# Altium footprint library UP-ROBOT Devices(2013-02-26).PcbLib: 150 footprints (part 4 of 10)
Each footprint in its own frame and in the unit in brackets; x right, y up, seen from the top. Pads: shape width x height; smd on the part's side, far side on the other; paste and mask are expansions set on the pad; w line width, h text height; cw(c..) or ccw(c..) is an arc to the next point about the centre after c.
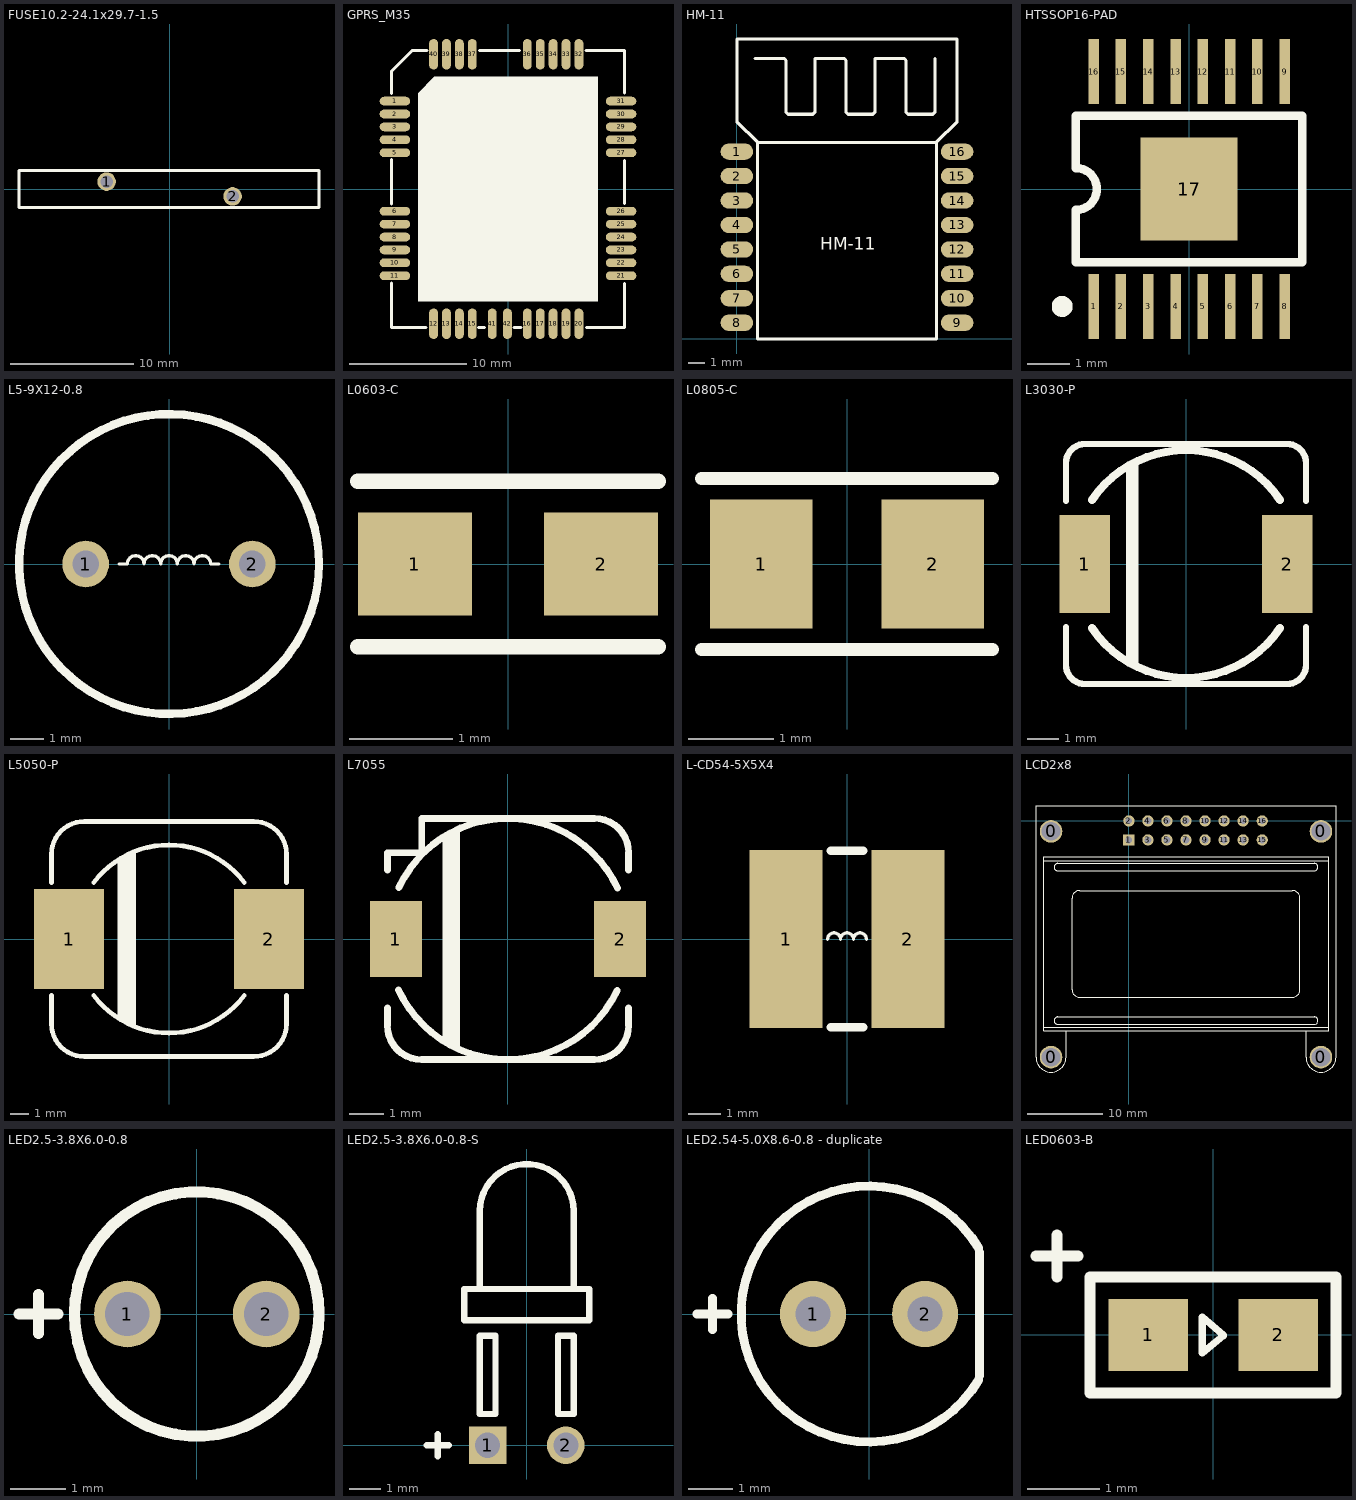
[diagram p3: the footprints below, top view; thin cyan lines are the x and y axes]

## FUSE10.2-24.1x29.7-1.5 [mm]
pads (2):
  round 1.5 hole 1: 1(-5.1,0.6) 2(5.1,-0.6)
Top Overlay:
  lines w0.254: -12.2,-1.5 12.1,-1.5 12.1,1.5 -12.2,1.5 -12.2,-1.5
3D body: height 29.85, standoff -3.85, extent -12.1,-1.5 12,1.5

## GPRS_M35 [mm]
pads (42):
  oval 2.6x0.75 smd: 1(-9.65,7.5) 2(-9.65,6.4) 3(-9.65,5.3) 4(-9.65,4.2) 5(-9.65,3.1) 6(-9.65,-1.9) 7(-9.65,-3) 8(-9.65,-4.1) 9(-9.65,-5.2) 10(-9.65,-6.3) 11(-9.65,-7.4) 21(9.65,-7.4) 22(9.65,-6.3) 23(9.65,-5.2) 24(9.65,-4.1) 25(9.65,-3) 26(9.65,-1.9) 27(9.65,3.1) 28(9.65,4.2) 29(9.65,5.3) 30(9.65,6.4) 31(9.65,7.5)
  oval 0.75x2.6 smd: 12(-6.35,-11.5) 13(-5.25,-11.5) 14(-4.15,-11.5) 15(-3.05,-11.5) 16(1.65,-11.5) 17(2.75,-11.5) 18(3.85,-11.5) 19(4.95,-11.5) 20(6.05,-11.5) 32(6.05,11.5) 33(4.95,11.5) 34(3.85,11.5) 35(2.75,11.5) 36(1.65,11.5) 37(-3.05,11.5) 38(-4.15,11.5) 39(-5.25,11.5) 40(-6.35,11.5) 41(-1.35,-11.5) 42(-0.05,-11.5)
Top Overlay:
  rectangle: -7.7,-9.6 -6.2,8.2
  region: -6.291,6.775 -4.884,8.182 -6.299,9.596 -7.706,8.189
  rectangle: -6.3,-9.6 7.7,9.6
  lines w0.254: -9.95,-8.025 -9.95,-11.8 -7,-11.8 ; -9.95,-1.275 -9.95,2.5 ; -9.95,8.15 -9.95,10.05 -8.2,11.8 ; -8.175,11.8 -6.9,11.8 ; -2.5,-11.8 -2,-11.8 ; -2.45,11.8 1,11.8 ; 0.5,-11.8 1.1,-11.8 ; 6.65,11.8 9.95,11.8 9.95,8.2 ; 6.7,-11.8 9.95,-11.8 9.95,-8.075 ; 9.95,-1.225 9.95,2.425

## HM-11 [mm] "Bluetooth4.0 HM-11"
pads (16):
  oval 2x1 smd: 1(0,11.5) 2(0,10) 3(0,8.5) 4(0,7) 5(0,5.5) 6(0,4) 7(0,2.5) 8(0,1) 9(13.513,1) 10(13.513,2.5) 11(13.513,4) 12(13.513,5.5) 13(13.513,7) 14(13.513,8.5) 15(13.513,10) 16(13.513,11.5)
Top Overlay:
  lines w0.2: 1.106,17.224 2.884,17.224 3.011,17.097 3.011,13.922 3.138,13.795 4.662,13.795 4.789,13.922 4.789,17.224 6.567,17.224 6.694,17.097 6.694,13.922 6.821,13.795 8.345,13.795 8.472,13.922 8.472,17.224 10.25,17.224 10.377,17.097 10.377,13.922 10.504,13.795 12.028,13.795 12.155,13.922 12.155,17.224 ; 1.27,12.065 1.27,0 12.243,0 12.243,12.065 ; 1.27,12.065 12.243,12.065 ; 1.27,12.065 0,13.335 0,18.415 13.513,18.415 13.513,13.335 12.243,12.065
  text "HM-11" at 5.11,5.47 h0.76

## HTSSOP16-PAD [mm]
pads (17):
  rect 0.25x1.55 smd: 1(-2.275,-2.8) 2(-1.625,-2.8) 3(-0.975,-2.8) 4(-0.325,-2.8) 5(0.325,-2.8) 6(0.975,-2.8) 7(1.625,-2.8) 8(2.275,-2.8) 9(2.275,2.8) 10(1.625,2.8) 11(0.975,2.8) 12(0.325,2.8) 13(-0.325,2.8) 14(-0.975,2.8) 15(-1.625,2.8) 16(-2.275,2.8)
  rect 2.31x2.46 smd: 17(0,0)
Top Overlay:
  circle w0.25: c-3.025,-2.8 r0.125
  lines w0.203: -2.7,-1.75 -2.7,-0.5 ccw(c-2.7,0) -2.7,0.5 -2.7,1.75 0,1.75 2.7,1.75 2.7,-1.75 -2.7,-1.75
3D body: height 1.2, standoff 0, extent -2.56,-3.3 2.54,3.3

## L5-9X12-0.8 [mm]
pads (2):
  round 1.4 hole 0.8: 1(-2.5,0) 2(2.5,0)
Top Overlay:
  circle w0.254: c0,0 r4.5
  lines w0.1: -1.5,0 -1.25,0 cw(c-1,0) -0.75,0 cw(c-0.5,0) -0.25,0 cw(c0,0) 0.25,0 cw(c0.5,0) 0.75,0 cw(c1,0) 1.25,0 1.5,0

## L0603-C [mm]
pads (2):
  rect 1.1x1 smd: 1(-0.9,0) 2(0.9,0)
Top Overlay:
  lines w0.152: -1.45,-0.8 1.45,-0.8 ; -1.45,0.8 0,0.8 1.45,0.8
3D body: height 0.46, standoff 0, extent -0.762,-0.386 0.762,0.381

## L0805-C [mm]
pads (2):
  rect 1.2x1.5 smd: 1(-1,0) 2(1,0)
Top Overlay:
  lines w0.152: -1.7,-1 1.7,-1 ; -1.7,1 1.7,1
3D body: height 0.61, standoff 0, extent -0.95,-0.65 1.082,0.625

## L3030-P [mm]
pads (2):
  rect 1.6x3.1 smd: 1(-3.2,0) 2(3.2,0)
Top Overlay:
  rectangle: -1.9,-3.2 -1.5,3.2
  lines w0.203: -3.8,-2 -3.8,-3.2 ccw(c-3.2,-3.2) -3.2,-3.8 3.2,-3.8 ccw(c3.2,-3.2) 3.8,-3.2 3.8,-2 ; -3.8,2 -3.8,3.2 cw(c-3.2,3.2) -3.2,3.8 3.2,3.8 cw(c3.2,3.2) 3.8,3.2 3.8,2
  lines w0.254: -2.977,-2.034 ccw(c0,0) 2.977,-2.034 ; -2.977,2.034 cw(c0,0) 2.977,2.034
3D body: height 4.36, standoff 0, extent -3.5,-3.55 3.5,3.45

## L5050-P [mm]
pads (2):
  rect 3.8x5.4 smd: 1(-5.4,0) 2(5.4,0)
Top Overlay:
  lines w0.254: -6.35,-3.048 -6.35,-4.572 ccw(c-4.572,-4.572) -4.572,-6.35 4.572,-6.35 ccw(c4.572,-4.572) 6.35,-4.572 6.35,-3.048 ; -6.35,3.048 -6.35,4.572 cw(c-4.572,4.572) -4.572,6.35 4.572,6.35 cw(c4.572,4.572) 6.35,4.572 6.35,3.048 ; -4.064,-3.048 ccw(c0,0) 4.064,-3.048 ; -4.064,3.048 cw(c0,0) 4.064,3.048 ; -2.667,-4.318 -2.667,4.318 ; -2.413,-4.445 -2.413,4.445 ; -2.159,-4.572 -2.159,4.572 ; -1.905,-4.699 -1.905,4.699
3D body: height 6, standoff 0, extent -6.179,-5.969 6.121,6.331

## L7055 [mm]
pads (2):
  rect 1.5x2.2 smd: 1(-3.25,0) 2(3.25,0)
Top Overlay:
  rectangle: -1.69,-3.13 -1.39,3.13
  rectangle: -1.9,-3.03 -1.6,3.03
  lines w0.2: -3.5,-2 -3.5,-2.5 ccw(c-2.5,-2.5) -2.5,-3.5 2.5,-3.5 ccw(c2.5,-2.5) 3.5,-2.5 3.5,-2 ; -3.5,2 -3.5,2.5 -2.5,2.5 -2.5,3.5 2.5,3.5 cw(c2.5,2.5) 3.5,2.5 3.5,2 ; -3.171,-1.482 ccw(c0,0) 3.167,-1.489 ; -3.167,1.489 cw(c0,0) 3.171,1.482
3D body: height 5.5, standoff 0, extent -3.6,-3.5 3.6,3.5

## L-CD54-5X5X4 [mm]
pads (2):
  rect 2.25x5.5 smd: 1(-1.875,0) 2(1.875,0)
Top Overlay:
  lines w0.1: -0.6,-0.01 cw(c-0.4,-0.01) -0.2,-0.01 cw(c0,-0.01) 0.2,-0.01 cw(c0.4,-0.01) 0.6,-0.01
  lines w0.254: -0.5,-2.72 0.5,-2.72 ; -0.5,2.72 0.5,2.72

## LCD2x8 [mm] "SC802A"
pads (20):
  round 3 hole 2.5: 0(-10.38,-31.5) 0(-10.38,-1.4) 0(25.62,-31.5) 0(25.62,-1.4)
  rect 1.5x1.5 hole 0.9: 1(0,-2.54)
  round 1.5 hole 0.9: 2(0,0) 3(2.54,-2.54) 4(2.54,0) 5(5.08,-2.54) 6(5.08,0) 7(7.62,-2.54) 8(7.62,0) 9(10.16,-2.54) 10(10.16,0) 11(12.7,-2.54) 12(12.7,0) 13(15.24,-2.54) 14(15.24,0) 15(17.78,-2.54) 16(17.78,0)
Top Overlay:
  lines w0.127: -8.38,-28 -8.38,-31.5 cw(c-10.38,-31.5) -12.38,-31.5 -12.38,-27.478 -12.38,2 27.62,2 27.62,-27.478 27.62,-31.5 cw(c25.62,-31.5) 23.62,-31.5 23.62,-28 ; -11.38,-27.5 26.62,-27.5 ; -11.38,-27.5 -11.38,-5.3 ; -11.38,-27.5 -11.38,-28 26.62,-28 26.62,-27.5 ; -11.38,-5.3 26.62,-5.3 ; -11.38,-5.3 -11.38,-4.8 26.62,-4.8 26.62,-5.3 ; 26.62,-27.5 26.62,-5.3 ; -9.469,-27.14 cw(c-9.469,-26.64) -9.469,-26.14 24.709,-26.14 cw(c24.709,-26.64) 24.709,-27.14 -9.469,-27.14 ; -9.469,-6.66 cw(c-9.469,-6.16) -9.469,-5.66 24.709,-5.66 cw(c24.709,-6.16) 24.709,-6.66 -9.469,-6.66 ; -7.58,-22.5 ccw(c-6.58,-22.5) -6.58,-23.5 21.82,-23.5 ccw(c21.82,-22.5) 22.82,-22.5 22.82,-10.3 ccw(c21.82,-10.3) 21.82,-9.3 -6.58,-9.3 ccw(c-6.58,-10.3) -7.58,-10.3 -7.58,-22.5

## LED2.5-3.8X6.0-0.8 [mm] "D3"
pads (2):
  round 1.2 hole 0.8: 1(-1.25,0) 2(1.25,0)
Top Overlay:
  circle w0.203: c0,0 r2.2
  lines w0.203: -3.2,0 -2.85,0 ; -2.85,-0.35 -2.85,0 ; -2.85,0.35 -2.85,0 ; -2.5,0 -2.85,0

## LED2.5-3.8X6.0-0.8-S [mm] "D3"
pads (2):
  rect 1.2x1.2 hole 0.8: 1(-1.25,0)
  round 1.2 hole 0.8: 2(1.25,0)
Top Overlay:
  lines w0.203: -3.2,0 -2.85,0 ; -2.85,-0.35 -2.85,0 ; -2.85,0.35 -2.85,0 ; -2.5,0 -2.85,0 ; -1.5,5 -1.5,7.5 cw(c0,7.5) 1.5,7.5 1.5,5 ; -2,4 0,4 2,4 2,5 -2,5 -2,4 ; -1.5,1 -1,1 -1,3.5 -1.5,3.5 -1.5,1 ; 1,1 1.5,1 1.5,3.5 1,3.5 1,1
3D body: height 4, standoff -1, extent -2,-0.175 2,9.075

## LED2.54-5.0X8.6-0.8 - duplicate [mm] "D3"
pads (2):
  round 1.5 hole 0.8: 1(-1.27,0) 2(1.27,0)
Top Overlay:
  lines w0.203: -3.9,0 -3.55,0 ; -3.55,-0.35 -3.55,0 ; -3.55,0.35 -3.55,0 ; -3.2,0 -3.55,0 ; 2.487,-1.492 cw(c0,0) 2.487,1.492 ; 2.5,-1.4 2.5,1.4
3D body: height 8.6, standoff -2, extent -2.9,-2.9 2.9,2.9

## LED0603-B [mm]
pads (2):
  rect 1.1x1 smd: 1(-0.9,0) 2(0.9,0)
Top Overlay:
  lines w0.1: 0.14,-0.01 -0.15,-0.25 -0.15,0.25 0.14,0
  lines w0.152: -2.45,1.09 -1.87,1.09 ; -2.16,0.8 -2.16,1.38 ; -1.7,-0.8 1.7,-0.8 1.7,0.8 0.153,0.8 -1.7,0.8 -1.7,-0.8
3D body: height 0.9, standoff 0, extent -0.85,-0.45 0.85,0.45